# Altium footprint library USLI_Schematics.PcbLib: 92 footprints (part 2 of 6)
Each footprint in its own frame and in the unit in brackets; x right, y up, seen from the top. Pads: shape width x height; smd on the part's side, far side on the other; paste and mask are expansions set on the pad; w line width, h text height; cw(c..) or ccw(c..) is an arc to the next point about the centre after c.
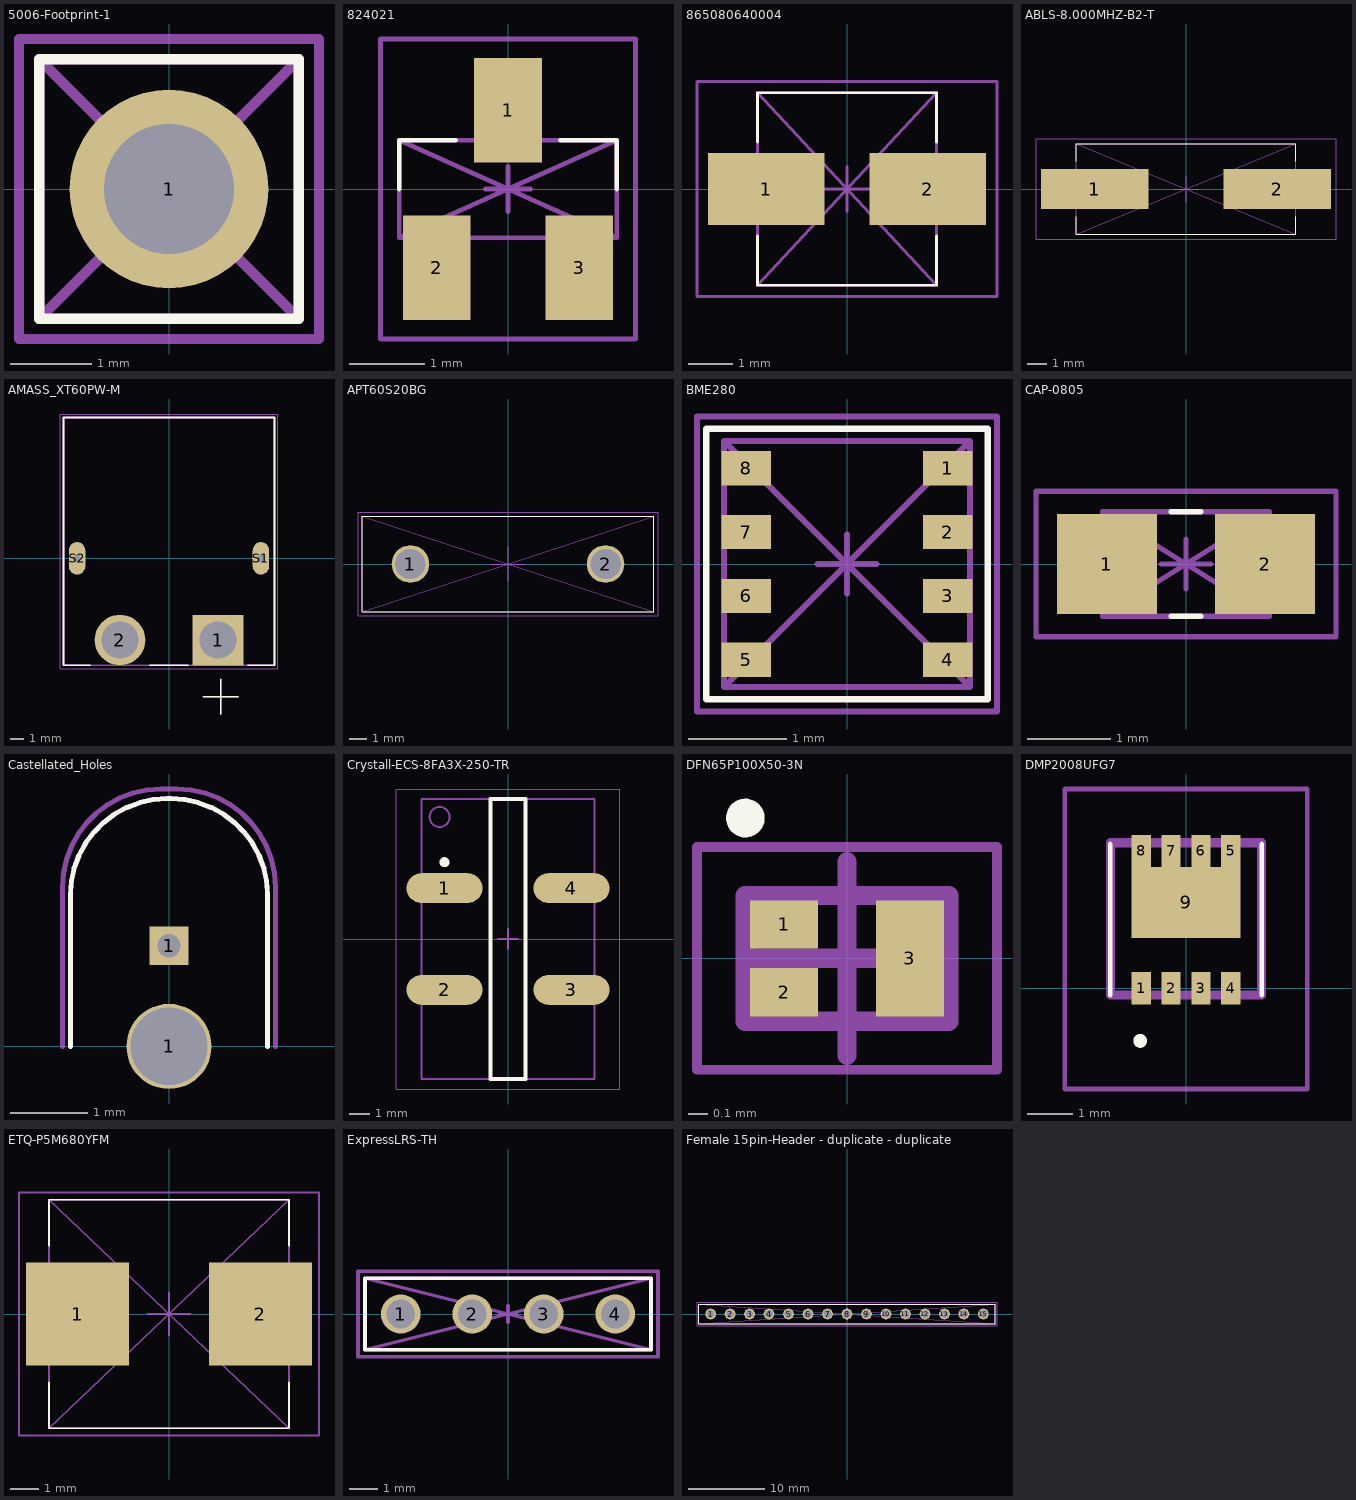
[diagram p1: the footprints below, top view; thin cyan lines are the x and y axes]

## 5005-TP [mm]

## 5006-Footprint-1 [mm]
pads (1):
  round 2.45 hole 1.6 mask+0.05: 1(0,0)
Top Overlay:
  lines w0.128: -1.6,-1.6 1.6,-1.6 1.6,1.6 -1.6,1.6 -1.6,-1.6
Mechanical 1:
  lines w0.128: -1.6,-1.6 1.6,-1.6 ; -1.6,-1.6 -1.6,1.6 ; -1.6,-1.6 1.6,1.6 ; -1.6,1.6 1.6,1.6 ; -1.6,1.6 1.6,-1.6 ; 1.6,-1.6 1.6,1.6
Top Courtyard:
  lines w0.128: -1.85,-1.85 1.85,-1.85 1.85,1.85 -1.85,1.85 -1.85,-1.85
Top Component Center:
  lines w0.128: -0.2,0 0.2,0 ; 0,-0.2 0,0.2
3D body "5006.step": height 5.58, standoff -3.3, extent -1.576,-1.587 1.576,1.587

## 824021 [mm]
pads (3):
  rect 0.9x1.4 smd mask+0.05: 1(0,1.05) 2(-0.95,-1.05) 3(0.95,-1.05)
Top Overlay:
  lines w0.064: -1.45,0 -1.45,0.65 -0.7,0.65 ; 0.7,0.65 1.45,0.65 1.45,0
Mechanical 1:
  lines w0.064: -1.45,-0.65 1.45,0.65 ; -1.45,-0.65 -1.45,0.65 ; -1.45,-0.65 1.45,-0.65 ; -1.45,0.65 1.45,-0.65 ; -1.45,0.65 1.45,0.65 ; 1.45,-0.65 1.45,0.65
Top Courtyard:
  lines w0.064: -1.7,-2 -1.7,2 1.7,2 1.7,-2 -1.7,-2
Top Component Center:
  lines w0.064: -0.3,0 0.3,0 ; 0,-0.3 0,0.3
3D body "Download_STP_WE-TVS-SOT23-3L_rev1.stp": height 1.01, standoff -0.03, extent -1.45,-1.2 1.45,1.2

## 865080640004 [mm]
pads (2):
  rect 2.6x1.6 smd mask+0.05: 1(-1.8,0) 2(1.8,0)
Top Overlay:
  lines w0.064: -2,-1.05 -2,-2.15 2,-2.15 2,-1.05 ; -2,1.05 -2,2.15 2,2.15 2,1.05
Mechanical 1:
  lines w0.064: -2,-2.15 2,2.15 ; -2,-2.15 -2,2.15 ; -2,-2.15 2,-2.15 ; -2,2.15 2,-2.15 ; -2,2.15 2,2.15 ; 2,-2.15 2,2.15
Top Courtyard:
  lines w0.064: -3.35,-2.4 -3.35,2.4 3.35,2.4 3.35,-2.4 -3.35,-2.4
Top Component Center:
  lines w0.064: -0.5,0 0.5,0 ; 0,-0.5 0,0.5
3D body "CAP_WCAP-ASLI_04p0X05p5_WRE.step": height 5.67, standoff 0.1, extent -2.604,-2.248 2.604,2.248

## ABLS-8.000MHZ-B2-T [mm]
pads (2):
  rect 5.6x2.1 smd mask+0.05: 1(-4.75,0) 2(4.75,0)
Top Overlay:
  lines w0.064: -5.7,-1.45 -5.7,-2.35 5.7,-2.35 5.7,-1.45 ; -5.7,1.45 -5.7,2.35 5.7,2.35 5.7,1.45
Mechanical 1:
  lines w0.064: -5.7,-2.35 5.7,2.35 ; -5.7,-2.35 -5.7,2.35 ; -5.7,-2.35 5.7,-2.35 ; -5.7,2.35 5.7,-2.35 ; -5.7,2.35 5.7,2.35 ; 5.7,-2.35 5.7,2.35
Top Courtyard:
  lines w0.064: -7.8,-2.6 -7.8,2.6 7.8,2.6 7.8,-2.6 -7.8,-2.6
Top Component Center:
  lines w0.064: -0.65,0 0.65,0 ; 0,-0.65 0,0.65
3D body "ABLS-8.000MHZ-B2-T.step": height 4.3, standoff 0.1, extent -6.35,-2.35 6.35,2.35

## AMASS_XT60PW-M [mm]
height 8.4
pads (4):
  rect 3.716x3.716 / inner round 3.716 / far side rect 3.716x3.716 hole 2.7: 1(3.6,-6)
  round 3.716 hole 2.7: 2(-3.6,-6)
  oval 1.2x2.4 hole 0.6 square: S1(6.75,0) S2(-6.75,0)
Top Overlay:
  lines w0.127: -5.778,-7.85 -7.75,-7.85 -7.75,10.35 7.75,10.35 7.75,-7.85 5.778,-7.85 ; -1.422,-7.85 1.422,-7.85 ; 2.54,-10.16 3.81,-10.16 ; 3.81,-11.43 3.81,-10.16 ; 3.81,-8.89 3.81,-10.16 ; 5.08,-10.16 3.81,-10.16
Mechanical 13:
  lines w0.127: 2.54,-10.16 3.81,-10.16 ; 3.81,-11.43 3.81,-10.16 ; 3.81,-8.89 3.81,-10.16 ; 5.08,-10.16 3.81,-10.16 ; -7.75,-7.85 -7.75,10.35 7.75,10.35 7.75,-7.85 -7.75,-7.85
Mechanical 15:
  lines w0.05: -8,-8.11 -8,10.6 8,10.6 8,-8.11 -8,-8.11
3D body "step_temp.STEP": height 8.4, standoff -2.55, extent -7.75,-7.85 7.75,10.35

## APT60S20BG [mm]
pads (2):
  round 2.1 hole 1.7 mask+0.05: 1(-5.45,0) 2(5.45,0)
Top Overlay:
  lines w0.064: -8.13,-2.655 -8.13,2.655 8.13,2.655 8.13,-2.655 -8.13,-2.655
Mechanical 1:
  lines w0.064: -8.13,-2.655 8.13,2.655 ; -8.13,-2.655 -8.13,2.655 ; -8.13,-2.655 8.13,-2.655 ; -8.13,2.655 8.13,-2.655 ; -8.13,2.655 8.13,2.655 ; 8.13,-2.655 8.13,2.655
Top Courtyard:
  lines w0.064: -8.38,-2.905 -8.38,2.905 8.38,2.905 8.38,-2.905 -8.38,-2.905
Top Component Center:
  lines w0.064: -1,0 1,0 ; 0,-1 0,1

## BME280 [mm]
pads (8):
  rect 0.5x0.35 smd mask+0.05: 1(1.025,0.975) 2(1.025,0.325) 3(1.025,-0.325) 4(1.025,-0.975) 5(-1.025,-0.975) 6(-1.025,-0.325) 7(-1.025,0.325) 8(-1.025,0.975)
Top Overlay:
  lines w0.064: -1.43,-1.375 -1.43,1.375 1.43,1.375 1.43,-1.375 -1.43,-1.375
Mechanical 1:
  lines w0.064: -1.25,-1.25 1.25,1.25 ; -1.25,-1.25 -1.25,1.25 ; -1.25,-1.25 1.25,-1.25 ; -1.25,1.25 1.25,-1.25 ; -1.25,1.25 1.25,1.25 ; 1.25,-1.25 1.25,1.25
Top Courtyard:
  lines w0.064: -1.525,-1.5 -1.525,1.5 1.525,1.5 1.525,-1.5 -1.525,-1.5
Top Component Center:
  lines w0.064: -0.3,0 0.3,0 ; 0,-0.3 0,0.3
3D body "BME280.step": height 1.02, standoff 0.02, extent -1.25,-1.25 1.25,1.25

## CAP-0805 [mm]
pads (2):
  rect 1.2x1.2 smd mask+0.05: 1(-0.95,0) 2(0.95,0)
Top Overlay:
  lines w0.064: -0.175,-0.625 0.175,-0.625 ; -0.175,0.625 0.175,0.625
Mechanical 1:
  lines w0.064: -1,-0.625 1,0.625 ; -1,-0.625 -1,0.625 ; -1,-0.625 1,-0.625 ; -1,0.625 1,-0.625 ; -1,0.625 1,0.625 ; 1,-0.625 1,0.625
Top Courtyard:
  lines w0.064: -1.8,-0.875 -1.8,0.875 1.8,0.875 1.8,-0.875 -1.8,-0.875
Top Component Center:
  lines w0.064: -0.3,0 0.3,0 ; 0,-0.3 0,0.3
3D body "KGM21NR71E104KT.STEP": height 0.72, standoff -0.53, extent -1.005,-0.5 1.005,0.5

## Castellated_Holes [mm]
pads (2):
  round 1.1 hole 1 mask+0.05: 1(0,0)
  rect 0.5x0.5 hole 0.3 mask+0: 1(0,1.3)
Top Overlay:
  lines w0.064: -1.275,0 -1.275,1.95 cw(c-0.025,1.95) -0.025,3.2 0.025,3.2 cw(c0.025,1.95) 1.275,1.95 1.275,0
Mechanical 1:
  lines w0.064: -1.275,0 -1.275,1.95 cw(c-0.025,1.95) -0.025,3.2 0.025,3.2 cw(c0.025,1.95) 1.275,1.95 1.275,0
Top Courtyard:
  lines w0.064: -1.375,0 -1.375,2.055 cw(c-0.105,2.055) -0.105,3.325 0.105,3.325 cw(c0.105,2.055) 1.375,2.055 1.375,0
Top Component Center:
  lines w0.064: -0.3,0 0,0 0.3,0 ; 0,-0.3 0,0.3
Multi-Layer:
  region: -1,0 -1,2 -1,2.091 -0.964,2.27 -0.895,2.438 -0.793,2.59 -0.665,2.718 -0.513,2.82 -0.345,2.889 -0.166,2.925 -0.075,2.925 0.075,2.925 0.166,2.925 0.345,2.889 0.513,2.82 0.665,2.718 0.793,2.59 0.895,2.438 0.964,2.27 1,2.091 1,2 1,0

## Crystall-ECS-8FA3X-250-TR [mm] "SOJ, 4-Leads, Body 14.00x9.80mm, Pitch 5.08mm, IPC Low Density"
height 4.7
pads (4):
  oval 3.8x1.5 smd: 1(-3.175,2.54) 2(-3.175,-2.54) 3(3.175,-2.54) 4(3.175,2.54)
Top Overlay:
  circle w0.25: c-3.175,3.84 r0.125
  lines w0.2: -0.875,-7 -0.875,7 0.875,7 0.875,-7 -0.875,-7
Top Courtyard:
  lines w0.05: -5.575,-7.5 -5.575,7.5 5.575,7.5 5.575,-7.5 -5.575,-7.5
  lines w0.1: -0.5,0 0.5,0 ; 0,-0.5 0,0.5
Top Assembly:
  circle w0.1: c-3.425,6.1 r0.5
  lines w0.1: -4.325,-7 -4.325,7 4.325,7 4.325,-7 -4.325,-7
3D body: height 4.7, standoff 0.25, extent -4.325,-7 4.325,7

## DFN65P100X50-3N [mm] "DFN, 3-Leads, Body 0.60x1.00mm, Pitch 0.65mm, IPC Medium Density"
height 0.5
pads (3):
  rect 0.35x0.25 smd mask+0.05: 1(-0.325,0.175) 2(-0.325,-0.175)
  rect 0.35x0.6 smd mask+0.05: 3(0.325,0)
Top Overlay:
  circle w0.1: c-0.525,0.725 r0.05
Top Courtyard:
  lines w0.05: -0.775,-0.575 0.775,-0.575 0.775,0.575 -0.775,0.575 -0.775,-0.575
  lines w0.1: -0.5,0 0.5,0 ; 0,-0.5 0,0.5
Top Assembly:
  lines w0.1: -0.525,-0.325 0.525,-0.325 0.525,0.325 -0.525,0.325 -0.525,-0.325
3D body: height 0.5, standoff 0, extent -0.525,-0.325 0.525,0.325

## DMP2008UFG7 [mm] "POWERDI3333-8"
pads (9):
  rect 0.42x0.7 smd: 1(-0.975,0) 2(-0.325,0) 3(0.325,0) 4(0.975,0) 5(0.975,3) 6(0.325,3) 7(-0.325,3) 8(-0.975,3)
  rect 2.37x1.55 smd: 9(0,1.875)
Top Overlay:
  lines w0.1: -1.65,-0.15 -1.65,3.15 ; 1.65,-0.15 1.65,3.15
  lines w0.2: -1,-1.2 ccw(c-1,-1.15) -1,-1.1 ccw(c-1,-1.15) -1,-1.2
Mechanical 13:
  lines w0.2: -1.651,-0.15 -1.651,3.175 1.651,3.175 1.651,-0.15 -1.651,-0.15
Mechanical 15:
  lines w0.1: -2.65,-2.2 -2.65,4.35 2.65,4.35 2.65,-2.2 -2.65,-2.2
3D body "DMP2005UFG-13.stp": height 0.95, standoff 0, extent -1.65,-0.308 1.65,3.308

## ETQ-P5M680YFM [mm]
pads (2):
  rect 3.6x3.6 smd mask+0.05: 1(-3.2,0) 2(3.2,0)
Top Overlay:
  lines w0.064: -4.2,-2.4 -4.2,-4 4.2,-4 4.2,-2.4 ; -4.2,2.4 -4.2,4 4.2,4 4.2,2.4
Mechanical 1:
  lines w0.064: -4.2,-4 4.2,4 ; -4.2,-4 -4.2,4 ; -4.2,-4 4.2,-4 ; -4.2,4 4.2,-4 ; -4.2,4 4.2,4 ; 4.2,-4 4.2,4
Top Courtyard:
  lines w0.064: -5.25,-4.25 -5.25,4.25 5.25,4.25 5.25,-4.25 -5.25,-4.25
Top Component Center:
  lines w0.064: -0.75,0 0.75,0 ; 0,-0.75 0,0.75
3D body "PCC-M0754M.step": height 5.49, standoff 0.09, extent -3.76,-3.5 3.81,3.5

## ExpressLRS-TH [mm]
pads (4):
  round 1.4 hole 1.02 mask+0.05: 1(-3.81,0) 2(-1.27,0) 3(1.27,0) 4(3.81,0)
Top Overlay:
  lines w0.127: -5.08,-1.27 5.08,-1.27 5.08,1.27 -5.08,1.27 -5.08,-1.27
Mechanical 1:
  lines w0.127: -5.08,-1.27 5.08,1.27 ; -5.08,-1.27 5.08,-1.27 ; -5.08,-1.27 -5.08,1.27 ; -5.08,1.27 5.08,-1.27 ; -5.08,1.27 5.08,1.27 ; 5.08,-1.27 5.08,1.27
Top Courtyard:
  lines w0.127: -5.33,-1.52 -5.33,1.52 5.33,1.52 5.33,-1.52 -5.33,-1.52
Top Component Center:
  lines w0.127: -0.3,0 0.3,0 ; 0,-0.3 0,0.3
3D body "4 pin header male point 100 pitch.step": height 4.77, standoff -9.01, extent -4.94,-1.25 5.06,1.25

## Female 15pin-Header - duplicate - duplicate [mm]
pads (15):
  round 1.4 hole 1.02 mask+0.05: 1(-17.78,0) 2(-15.24,0) 3(-12.7,0) 4(-10.16,0) 5(-7.62,0) 6(-5.08,0) 7(-2.54,0) 8(0,0) 9(2.54,0) 10(5.08,0) 11(7.62,0) 12(10.16,0) 13(12.7,0) 14(15.24,0) 15(17.78,0)
Top Overlay:
  lines w0.064: -19.3,-1.27 -19.3,1.27 19.3,1.27 19.3,-1.27 -19.3,-1.27
Mechanical 1:
  lines w0.064: -19.3,-1.27 19.3,1.27 ; -19.3,-1.27 -19.3,1.27 ; -19.3,-1.27 19.3,-1.27 ; -19.3,1.27 19.3,-1.27 ; -19.3,1.27 19.3,1.27 ; 19.3,-1.27 19.3,1.27
Top Courtyard:
  lines w0.064: -19.55,-1.52 -19.55,1.52 19.55,1.52 19.55,-1.52 -19.55,-1.52
Top Component Center:
  lines w0.064: -0.775,0 0,0 0.775,0 ; 0,-0.775 0,0.775
3D body "PPTC151LFBN-RC--3DModel-STEP-56544.STEP": height 8.51, standoff -3.2, extent -19.304,-1.27 19.304,1.27